# Altium footprint library IC.PcbLib: 163 footprints (part 4 of 11)
Each footprint in its own frame and in the unit in brackets; x right, y up, seen from the top. Pads: shape width x height; smd on the part's side, far side on the other; paste and mask are expansions set on the pad; w line width, h text height; cw(c..) or ccw(c..) is an arc to the next point about the centre after c.
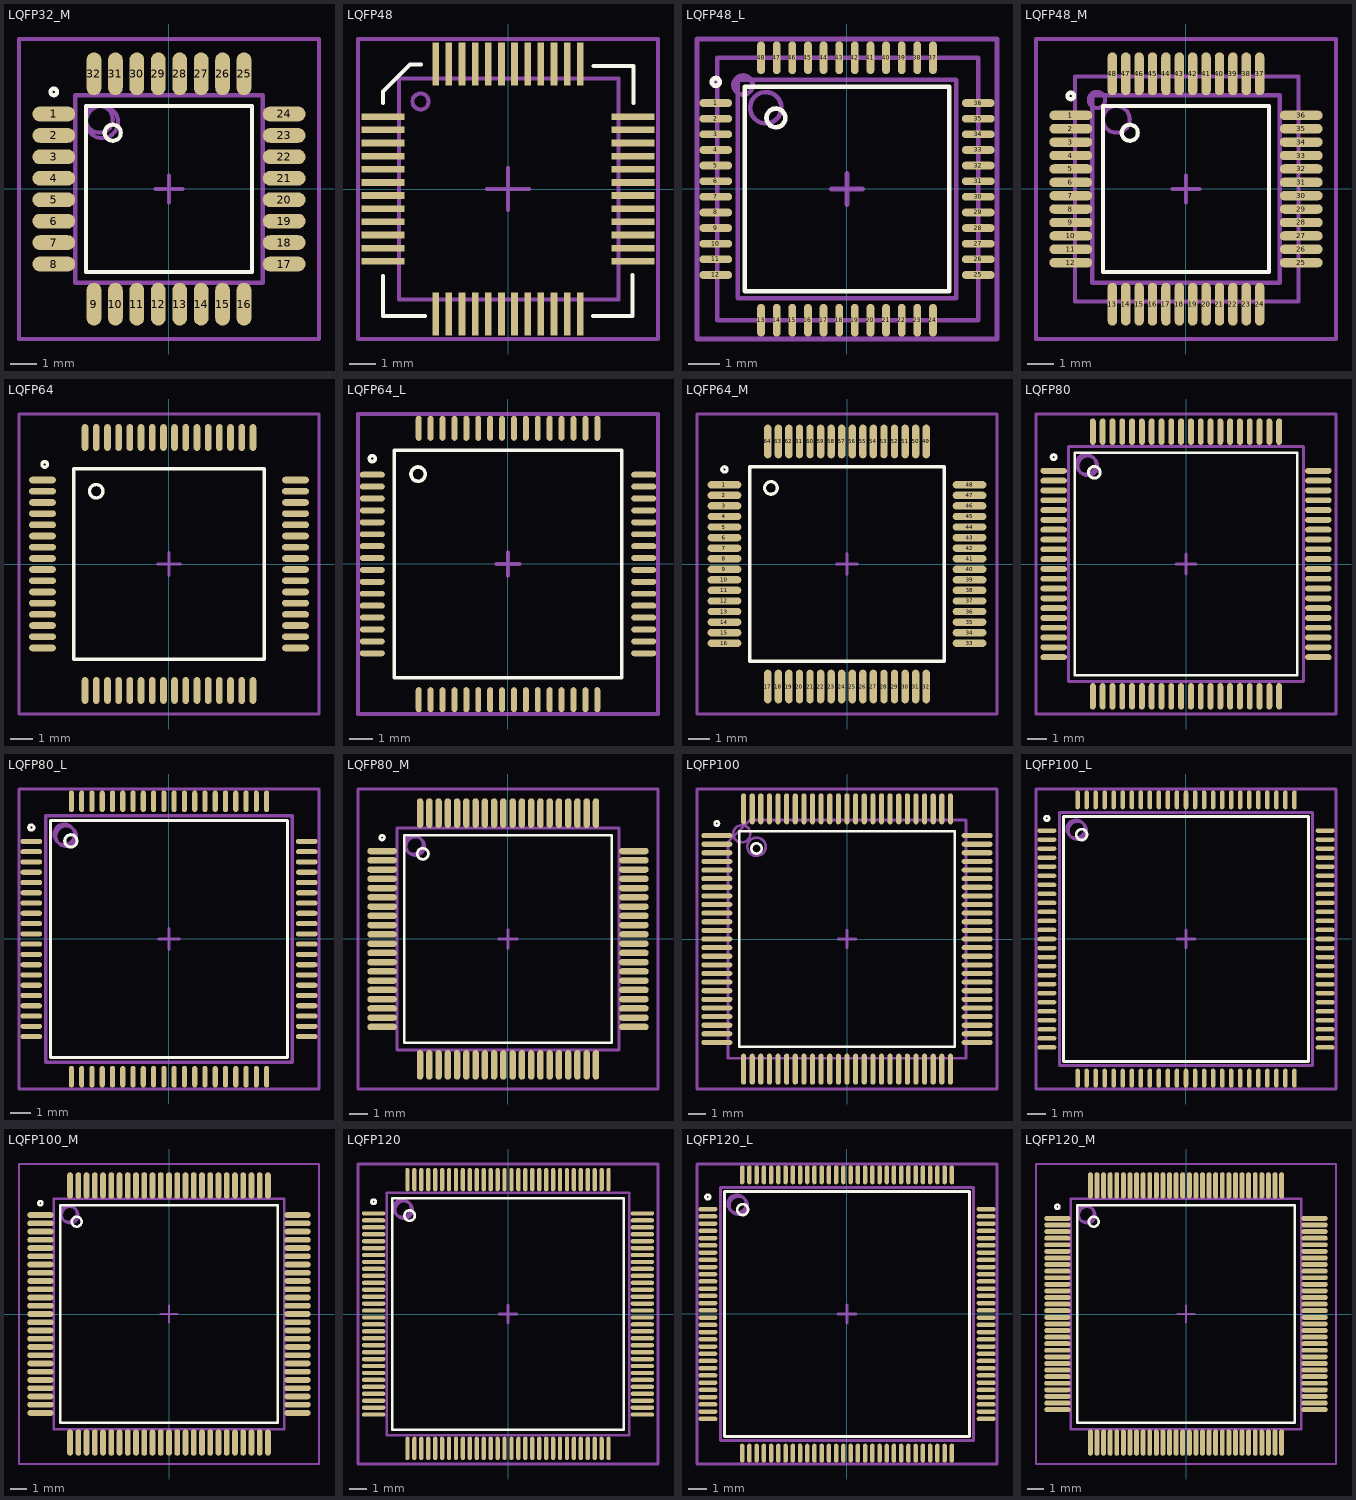
[diagram p3: the footprints below, top view; thin cyan lines are the x and y axes]

## LQFP32_M [mm] "TQFP, 32-Leads, Body 7,00x7,00mm, Pitch 0,80mm, IPC Low Density"
height 1.5
pads (32):
  oval 1.6x0.55 smd: 1(-4.3,2.8) 2(-4.3,2) 3(-4.3,1.2) 4(-4.3,0.4) 5(-4.3,-0.4) 6(-4.3,-1.2) 7(-4.3,-2) 8(-4.3,-2.8) 17(4.3,-2.8) 18(4.3,-2) 19(4.3,-1.2) 20(4.3,-0.4) 21(4.3,0.4) 22(4.3,1.2) 23(4.3,2) 24(4.3,2.8)
  oval 0.55x1.6 smd: 9(-2.8,-4.3) 10(-2,-4.3) 11(-1.2,-4.3) 12(-0.4,-4.3) 13(0.4,-4.3) 14(1.2,-4.3) 15(2,-4.3) 16(2.8,-4.3) 25(2.8,4.3) 26(2,4.3) 27(1.2,4.3) 28(0.4,4.3) 29(-0.4,4.3) 30(-1.2,4.3) 31(-2,4.3) 32(-2.8,4.3)
Top Overlay:
  circle w0.15: c-2.1,2.1 r0.3
  circle w0.15: c-4.3,3.625 r0.125
  lines w0.15: -3.1,-3.1 3.1,-3.1 3.1,3.1 -3.1,3.1 -3.1,-3.1
Mechanical 13:
  circle w0.15: c-2.6,2.6 r0.5
  lines w0.15: -3.5,-3.5 3.5,-3.5 3.5,3.5 -3.5,3.5 -3.5,-3.5
Mechanical 15:
  lines w0.15: -0.5,0 0.5,0 ; 0,-0.5 0,0.5 ; -5.6,-5.6 5.6,-5.6 5.6,5.6 -5.6,5.6 -5.6,-5.6
Mechanical 29:
  circle w0.15: c-2.5,2.5 r0.6
  lines w0.15: -3.5,-3.5 3.5,-3.5 3.5,3.5 -3.5,3.5 -3.5,-3.5
  text ".Designator" at -2.8,-0.3 h1
3D body: height 1.5, standoff 0.1, extent -3.5,-3.5 3.5,3.5

## LQFP48 [mm]
pads (48):
  rect 1.65x0.254 smd: 1(-4.75,2.75) 2(-4.75,2.25) 3(-4.75,1.75) 4(-4.75,1.25) 5(-4.75,0.75) 6(-4.75,0.25) 7(-4.75,-0.25) 8(-4.75,-0.75) 9(-4.75,-1.25) 10(-4.75,-1.75) 11(-4.75,-2.25) 12(-4.75,-2.75) 25(4.75,-2.75) 26(4.75,-2.25) 27(4.75,-1.75) 28(4.75,-1.25) 29(4.75,-0.75) 30(4.75,-0.25) 31(4.75,0.25) 32(4.75,0.75) 33(4.75,1.25) 34(4.75,1.75) 35(4.75,2.25) 36(4.75,2.75)
  rect 0.254x1.65 smd: 13(-2.75,-4.75) 14(-2.25,-4.75) 15(-1.75,-4.75) 16(-1.25,-4.75) 17(-0.75,-4.75) 18(-0.25,-4.75) 19(0.25,-4.75) 20(0.75,-4.75) 21(1.25,-4.75) 22(1.75,-4.75) 23(2.25,-4.75) 24(2.75,-4.75) 37(2.75,4.75) 38(2.25,4.75) 39(1.75,4.75) 40(1.25,4.75) 41(0.75,4.75) 42(0.25,4.75) 43(-0.25,4.75) 44(-0.75,4.75) 45(-1.25,4.75) 46(-1.75,4.75) 47(-2.25,4.75) 48(-2.75,4.75)
Top Overlay:
  lines w0.15: -4.75,-3.3 -4.75,-4.825 -3.15,-4.825 ; -4.75,3.275 -4.75,3.7 -3.725,4.725 -3.3,4.725 ; 3.225,-4.825 4.725,-4.825 4.725,-3.275 ; 3.25,4.675 4.775,4.675 4.775,3.275
Mechanical 15:
  lines w0.15: -0.8,0 0,0 ; 0,-0.8 0,0 ; 0,0.8 0,0 ; 0.8,0 0,0 ; -5.7,-5.7 5.7,-5.7 5.7,5.7 -5.7,5.7 -5.7,-5.7
Mechanical 29:
  circle w0.15: c-3.325,3.325 r0.305
  lines w0.15: -4.15,-4.2 4.2,-4.2 4.2,4.2 -4.15,4.2 -4.15,-4.2
  text ".Designator" at -3.1,-0.2 h1
3D body "User Library-Quad50M48.step": height 1.56, standoff 0, extent -4.5,-4.511 4.5,4.489

## LQFP48_L [mm] "TSQFP, 48-Leads, Body 7,00x7,00mm, Pitch 0,50mm, IPC High Density"
height 1.5
pads (48):
  oval 1.05x0.25 smd: 1(-4.2,2.75) 2(-4.2,2.25) 3(-4.2,1.75) 4(-4.2,1.25) 5(-4.2,0.75) 6(-4.2,0.25) 7(-4.2,-0.25) 8(-4.2,-0.75) 9(-4.2,-1.25) 10(-4.2,-1.75) 11(-4.2,-2.25) 12(-4.2,-2.75) 25(4.2,-2.75) 26(4.2,-2.25) 27(4.2,-1.75) 28(4.2,-1.25) 29(4.2,-0.75) 30(4.2,-0.25) 31(4.2,0.25) 32(4.2,0.75) 33(4.2,1.25) 34(4.2,1.75) 35(4.2,2.25) 36(4.2,2.75)
  oval 0.25x1.05 smd: 13(-2.75,-4.2) 14(-2.25,-4.2) 15(-1.75,-4.2) 16(-1.25,-4.2) 17(-0.75,-4.2) 18(-0.25,-4.2) 19(0.25,-4.2) 20(0.75,-4.2) 21(1.25,-4.2) 22(1.75,-4.2) 23(2.25,-4.2) 24(2.75,-4.2) 37(2.75,4.2) 38(2.25,4.2) 39(1.75,4.2) 40(1.25,4.2) 41(0.75,4.2) 42(0.25,4.2) 43(-0.25,4.2) 44(-0.75,4.2) 45(-1.25,4.2) 46(-1.75,4.2) 47(-2.25,4.2) 48(-2.75,4.2)
Top Overlay:
  circle w0.15: c-2.275,2.275 r0.3
  circle w0.15: c-4.2,3.425 r0.125
  lines w0.15: -3.275,-3.275 3.275,-3.275 3.275,3.275 -3.275,3.275 -3.275,-3.275
Mechanical 13:
  circle w0.15: c-2.6,2.6 r0.5
  lines w0.15: -3.5,-3.5 3.5,-3.5 3.5,3.5 -3.5,3.5 -3.5,-3.5
Mechanical 15:
  lines w0.15: -0.5,0 0.5,0 ; 0,-0.5 0,0.5 ; -4.8,-4.8 4.8,-4.8 4.8,4.8 -4.8,4.8 -4.8,-4.8
Mechanical 29:
  circle w0.15: c-3.325,3.325 r0.305
  lines w0.15: -4.15,-4.2 4.2,-4.2 4.2,4.2 -4.15,4.2 -4.15,-4.2
  text ".Designator" at -3.1,-0.3 h1
3D body: height 1.5, standoff 0.1, extent -3.5,-3.5 3.5,3.5

## LQFP48_M [mm] "TSQFP, 48-Leads, Body 7,00x7,00mm, Pitch 0,50mm, IPC Low Density"
height 1.5
pads (48):
  oval 1.6x0.35 smd: 1(-4.3,2.75) 2(-4.3,2.25) 3(-4.3,1.75) 4(-4.3,1.25) 5(-4.3,0.75) 6(-4.3,0.25) 7(-4.3,-0.25) 8(-4.3,-0.75) 9(-4.3,-1.25) 10(-4.3,-1.75) 11(-4.3,-2.25) 12(-4.3,-2.75) 25(4.3,-2.75) 26(4.3,-2.25) 27(4.3,-1.75) 28(4.3,-1.25) 29(4.3,-0.75) 30(4.3,-0.25) 31(4.3,0.25) 32(4.3,0.75) 33(4.3,1.25) 34(4.3,1.75) 35(4.3,2.25) 36(4.3,2.75)
  oval 0.35x1.6 smd: 13(-2.75,-4.3) 14(-2.25,-4.3) 15(-1.75,-4.3) 16(-1.25,-4.3) 17(-0.75,-4.3) 18(-0.25,-4.3) 19(0.25,-4.3) 20(0.75,-4.3) 21(1.25,-4.3) 22(1.75,-4.3) 23(2.25,-4.3) 24(2.75,-4.3) 37(2.75,4.3) 38(2.25,4.3) 39(1.75,4.3) 40(1.25,4.3) 41(0.75,4.3) 42(0.25,4.3) 43(-0.25,4.3) 44(-0.75,4.3) 45(-1.25,4.3) 46(-1.75,4.3) 47(-2.25,4.3) 48(-2.75,4.3)
Top Overlay:
  circle w0.15: c-2.1,2.1 r0.3
  circle w0.15: c-4.3,3.475 r0.125
  lines w0.15: -3.1,-3.1 3.1,-3.1 3.1,3.1 -3.1,3.1 -3.1,-3.1
Mechanical 13:
  circle w0.15: c-2.6,2.6 r0.5
  lines w0.15: -3.5,-3.5 3.5,-3.5 3.5,3.5 -3.5,3.5 -3.5,-3.5
Mechanical 15:
  lines w0.15: -0.5,0 0.5,0 ; 0,-0.5 0,0.5 ; -5.6,-5.6 5.6,-5.6 5.6,5.6 -5.6,5.6 -5.6,-5.6
Mechanical 29:
  circle w0.15: c-3.325,3.325 r0.305
  lines w0.15: -4.15,-4.2 4.2,-4.2 4.2,4.2 -4.15,4.2 -4.15,-4.2
  text ".Designator" at -3.1,-0.4 h1
3D body: height 1.5, standoff 0.1, extent -3.5,-3.5 3.5,3.5

## LQFP64 [mm]
height 1.6
pads (64):
  oval 1.2x0.3 smd: 1(-5.65,3.75) 2(-5.65,3.25) 3(-5.65,2.75) 4(-5.65,2.25) 5(-5.65,1.75) 6(-5.65,1.25) 7(-5.65,0.75) 8(-5.65,0.25) 9(-5.65,-0.25) 10(-5.65,-0.75) 11(-5.65,-1.25) 12(-5.65,-1.75) 13(-5.65,-2.25) 14(-5.65,-2.75) 15(-5.65,-3.25) 16(-5.65,-3.75) 33(5.65,-3.75) 34(5.65,-3.25) 35(5.65,-2.75) 36(5.65,-2.25) 37(5.65,-1.75) 38(5.65,-1.25) 39(5.65,-0.75) 40(5.65,-0.25) 41(5.65,0.25) 42(5.65,0.75) 43(5.65,1.25) 44(5.65,1.75) 45(5.65,2.25) 46(5.65,2.75) 47(5.65,3.25) 48(5.65,3.75)
  oval 0.3x1.2 smd: 17(-3.75,-5.65) 18(-3.25,-5.65) 19(-2.75,-5.65) 20(-2.25,-5.65) 21(-1.75,-5.65) 22(-1.25,-5.65) 23(-0.75,-5.65) 24(-0.25,-5.65) 25(0.25,-5.65) 26(0.75,-5.65) 27(1.25,-5.65) 28(1.75,-5.65) 29(2.25,-5.65) 30(2.75,-5.65) 31(3.25,-5.65) 32(3.75,-5.65) 49(3.75,5.65) 50(3.25,5.65) 51(2.75,5.65) 52(2.25,5.65) 53(1.75,5.65) 54(1.25,5.65) 55(0.75,5.65) 56(0.25,5.65) 57(-0.25,5.65) 58(-0.75,5.65) 59(-1.25,5.65) 60(-1.75,5.65) 61(-2.25,5.65) 62(-2.75,5.65) 63(-3.25,5.65) 64(-3.75,5.65)
Top Overlay:
  circle w0.15: c-5.55,4.45 r0.125
  circle w0.15: c-3.25,3.25 r0.3
  lines w0.15: -4.25,-4.25 -4.25,4.25 4.25,4.25 4.25,-4.25 -4.25,-4.25
Mechanical 15:
  lines w0.15: -0.5,0 0.5,0 ; 0,-0.5 0,0.5 ; -6.7,-6.7 -6.7,6.7 6.7,6.7 6.7,-6.7 -6.7,-6.7
3D body "User Library-LQFP64-1.step": height 1.56, standoff 0, extent -6,-6 6,6

## LQFP64_L [mm] "TSQFP, 64-Leads, Body 10,00x10,00mm, Pitch 0,50mm, IPC High Density"
height 1.5
pads (64):
  oval 1.05x0.25 smd: 1(-5.7,3.75) 2(-5.7,3.25) 3(-5.7,2.75) 4(-5.7,2.25) 5(-5.7,1.75) 6(-5.7,1.25) 7(-5.7,0.75) 8(-5.7,0.25) 9(-5.7,-0.25) 10(-5.7,-0.75) 11(-5.7,-1.25) 12(-5.7,-1.75) 13(-5.7,-2.25) 14(-5.7,-2.75) 15(-5.7,-3.25) 16(-5.7,-3.75) 33(5.7,-3.75) 34(5.7,-3.25) 35(5.7,-2.75) 36(5.7,-2.25) 37(5.7,-1.75) 38(5.7,-1.25) 39(5.7,-0.75) 40(5.7,-0.25) 41(5.7,0.25) 42(5.7,0.75) 43(5.7,1.25) 44(5.7,1.75) 45(5.7,2.25) 46(5.7,2.75) 47(5.7,3.25) 48(5.7,3.75)
  oval 0.25x1.05 smd: 17(-3.75,-5.7) 18(-3.25,-5.7) 19(-2.75,-5.7) 20(-2.25,-5.7) 21(-1.75,-5.7) 22(-1.25,-5.7) 23(-0.75,-5.7) 24(-0.25,-5.7) 25(0.25,-5.7) 26(0.75,-5.7) 27(1.25,-5.7) 28(1.75,-5.7) 29(2.25,-5.7) 30(2.75,-5.7) 31(3.25,-5.7) 32(3.75,-5.7) 49(3.75,5.7) 50(3.25,5.7) 51(2.75,5.7) 52(2.25,5.7) 53(1.75,5.7) 54(1.25,5.7) 55(0.75,5.7) 56(0.25,5.7) 57(-0.25,5.7) 58(-0.75,5.7) 59(-1.25,5.7) 60(-1.75,5.7) 61(-2.25,5.7) 62(-2.75,5.7) 63(-3.25,5.7) 64(-3.75,5.7)
Top Overlay:
  circle w0.15: c-3.775,3.775 r0.3
  circle w0.15: c-5.7,4.425 r0.125
  lines w0.15: -4.775,-4.775 4.775,-4.775 4.775,4.775 -4.775,4.775 -4.775,-4.775
Mechanical 15:
  lines w0.15: -0.5,0 0.5,0 ; 0,-0.5 0,0.5 ; -6.3,-6.3 6.3,-6.3 6.3,6.3 -6.3,6.3 -6.3,-6.3
3D body "User Library-LQFP64-1.step": height 1.56, standoff 0, extent -6,-6 6,6

## LQFP64_M [mm] "TSQFP, 64-Leads, Body 10,00x10,00mm, Pitch 0,50mm, IPC Low Density"
height 1.5
pads (64):
  oval 1.6x0.35 smd: 1(-5.8,3.75) 2(-5.8,3.25) 3(-5.8,2.75) 4(-5.8,2.25) 5(-5.8,1.75) 6(-5.8,1.25) 7(-5.8,0.75) 8(-5.8,0.25) 9(-5.8,-0.25) 10(-5.8,-0.75) 11(-5.8,-1.25) 12(-5.8,-1.75) 13(-5.8,-2.25) 14(-5.8,-2.75) 15(-5.8,-3.25) 16(-5.8,-3.75) 33(5.8,-3.75) 34(5.8,-3.25) 35(5.8,-2.75) 36(5.8,-2.25) 37(5.8,-1.75) 38(5.8,-1.25) 39(5.8,-0.75) 40(5.8,-0.25) 41(5.8,0.25) 42(5.8,0.75) 43(5.8,1.25) 44(5.8,1.75) 45(5.8,2.25) 46(5.8,2.75) 47(5.8,3.25) 48(5.8,3.75)
  oval 0.35x1.6 smd: 17(-3.75,-5.8) 18(-3.25,-5.8) 19(-2.75,-5.8) 20(-2.25,-5.8) 21(-1.75,-5.8) 22(-1.25,-5.8) 23(-0.75,-5.8) 24(-0.25,-5.8) 25(0.25,-5.8) 26(0.75,-5.8) 27(1.25,-5.8) 28(1.75,-5.8) 29(2.25,-5.8) 30(2.75,-5.8) 31(3.25,-5.8) 32(3.75,-5.8) 49(3.75,5.8) 50(3.25,5.8) 51(2.75,5.8) 52(2.25,5.8) 53(1.75,5.8) 54(1.25,5.8) 55(0.75,5.8) 56(0.25,5.8) 57(-0.25,5.8) 58(-0.75,5.8) 59(-1.25,5.8) 60(-1.75,5.8) 61(-2.25,5.8) 62(-2.75,5.8) 63(-3.25,5.8) 64(-3.75,5.8)
Top Overlay:
  circle w0.15: c-3.6,3.6 r0.3
  circle w0.15: c-5.8,4.475 r0.125
  lines w0.15: -4.6,-4.6 4.6,-4.6 4.6,4.6 -4.6,4.6 -4.6,-4.6
Mechanical 15:
  lines w0.15: -0.5,0 0.5,0 ; 0,-0.5 0,0.5 ; -7.1,-7.1 7.1,-7.1 7.1,7.1 -7.1,7.1 -7.1,-7.1
3D body "User Library-LQFP64-1.step": height 1.56, standoff 0, extent -6,-6 6,6

## LQFP80 [mm] "TSQFP, 80-Leads, Body 12,00x12,00mm, Pitch 0,50mm, IPC Medium Density"
height 1.5
pads (80):
  oval 1.35x0.3 smd: 1(-6.75,4.75) 2(-6.75,4.25) 3(-6.75,3.75) 4(-6.75,3.25) 5(-6.75,2.75) 6(-6.75,2.25) 7(-6.75,1.75) 8(-6.75,1.25) 9(-6.75,0.75) 10(-6.75,0.25) 11(-6.75,-0.25) 12(-6.75,-0.75) 13(-6.75,-1.25) 14(-6.75,-1.75) 15(-6.75,-2.25) 16(-6.75,-2.75) 17(-6.75,-3.25) 18(-6.75,-3.75) 19(-6.75,-4.25) 20(-6.75,-4.75) 41(6.75,-4.75) 42(6.75,-4.25) 43(6.75,-3.75) 44(6.75,-3.25) 45(6.75,-2.75) 46(6.75,-2.25) 47(6.75,-1.75) 48(6.75,-1.25) 49(6.75,-0.75) 50(6.75,-0.25) 51(6.75,0.25) 52(6.75,0.75) 53(6.75,1.25) 54(6.75,1.75) 55(6.75,2.25) 56(6.75,2.75) 57(6.75,3.25) 58(6.75,3.75) 59(6.75,4.25) 60(6.75,4.75)
  oval 0.3x1.35 smd: 21(-4.75,-6.75) 22(-4.25,-6.75) 23(-3.75,-6.75) 24(-3.25,-6.75) 25(-2.75,-6.75) 26(-2.25,-6.75) 27(-1.75,-6.75) 28(-1.25,-6.75) 29(-0.75,-6.75) 30(-0.25,-6.75) 31(0.25,-6.75) 32(0.75,-6.75) 33(1.25,-6.75) 34(1.75,-6.75) 35(2.25,-6.75) 36(2.75,-6.75) 37(3.25,-6.75) 38(3.75,-6.75) 39(4.25,-6.75) 40(4.75,-6.75) 61(4.75,6.75) 62(4.25,6.75) 63(3.75,6.75) 64(3.25,6.75) 65(2.75,6.75) 66(2.25,6.75) 67(1.75,6.75) 68(1.25,6.75) 69(0.75,6.75) 70(0.25,6.75) 71(-0.25,6.75) 72(-0.75,6.75) 73(-1.25,6.75) 74(-1.75,6.75) 75(-2.25,6.75) 76(-2.75,6.75) 77(-3.25,6.75) 78(-3.75,6.75) 79(-4.25,6.75) 80(-4.75,6.75)
Top Overlay:
  circle w0.15: c-6.75,5.45 r0.125
  circle w0.15: c-4.675,4.675 r0.3
  lines w0.15: -5.675,-5.675 -5.675,5.675 5.675,5.675 5.675,-5.675 -5.675,-5.675
Mechanical 13:
  circle w0.15: c-5.1,5.1 r0.5
  lines w0.15: -6,-6 -6,6 6,6 6,-6 -6,-6
Mechanical 15:
  lines w0.15: -0.5,0 0.5,0 ; 0,-0.5 0,0.5 ; -7.65,-7.65 -7.65,7.65 7.65,7.65 7.65,-7.65 -7.65,-7.65
Mechanical 29:
  circle w0.15: c-5,5 r0.5
  lines w0.15: -6,-6 -6,6 6,6 6,-6 -6,-6
  text ".Designator" at -3.4,-0.2 h1
3D body: height 1.5, standoff 0.1, extent -6,-6 6,6

## LQFP80_L [mm] "TSQFP, 80-Leads, Body 12,00x12,00mm, Pitch 0,50mm, IPC High Density"
height 1.5
pads (80):
  oval 1.05x0.25 smd: 1(-6.7,4.75) 2(-6.7,4.25) 3(-6.7,3.75) 4(-6.7,3.25) 5(-6.7,2.75) 6(-6.7,2.25) 7(-6.7,1.75) 8(-6.7,1.25) 9(-6.7,0.75) 10(-6.7,0.25) 11(-6.7,-0.25) 12(-6.7,-0.75) 13(-6.7,-1.25) 14(-6.7,-1.75) 15(-6.7,-2.25) 16(-6.7,-2.75) 17(-6.7,-3.25) 18(-6.7,-3.75) 19(-6.7,-4.25) 20(-6.7,-4.75) 41(6.7,-4.75) 42(6.7,-4.25) 43(6.7,-3.75) 44(6.7,-3.25) 45(6.7,-2.75) 46(6.7,-2.25) 47(6.7,-1.75) 48(6.7,-1.25) 49(6.7,-0.75) 50(6.7,-0.25) 51(6.7,0.25) 52(6.7,0.75) 53(6.7,1.25) 54(6.7,1.75) 55(6.7,2.25) 56(6.7,2.75) 57(6.7,3.25) 58(6.7,3.75) 59(6.7,4.25) 60(6.7,4.75)
  oval 0.25x1.05 smd: 21(-4.75,-6.7) 22(-4.25,-6.7) 23(-3.75,-6.7) 24(-3.25,-6.7) 25(-2.75,-6.7) 26(-2.25,-6.7) 27(-1.75,-6.7) 28(-1.25,-6.7) 29(-0.75,-6.7) 30(-0.25,-6.7) 31(0.25,-6.7) 32(0.75,-6.7) 33(1.25,-6.7) 34(1.75,-6.7) 35(2.25,-6.7) 36(2.75,-6.7) 37(3.25,-6.7) 38(3.75,-6.7) 39(4.25,-6.7) 40(4.75,-6.7) 61(4.75,6.7) 62(4.25,6.7) 63(3.75,6.7) 64(3.25,6.7) 65(2.75,6.7) 66(2.25,6.7) 67(1.75,6.7) 68(1.25,6.7) 69(0.75,6.7) 70(0.25,6.7) 71(-0.25,6.7) 72(-0.75,6.7) 73(-1.25,6.7) 74(-1.75,6.7) 75(-2.25,6.7) 76(-2.75,6.7) 77(-3.25,6.7) 78(-3.75,6.7) 79(-4.25,6.7) 80(-4.75,6.7)
Top Overlay:
  circle w0.15: c-6.7,5.425 r0.125
  circle w0.15: c-4.775,4.775 r0.3
  lines w0.15: -5.775,-5.775 -5.775,5.775 5.775,5.775 5.775,-5.775 -5.775,-5.775
Mechanical 13:
  circle w0.15: c-5.1,5.1 r0.5
  lines w0.15: -6,-6 -6,6 6,6 6,-6 -6,-6
Mechanical 15:
  lines w0.15: -0.5,0 0.5,0 ; 0,-0.5 0,0.5 ; -7.3,-7.3 -7.3,7.3 7.3,7.3 7.3,-7.3 -7.3,-7.3
Mechanical 29:
  circle w0.15: c-5,5 r0.5
  lines w0.15: -6,-6 6,-6 6,6 -6,6 -6,-6
  text ".Designator" at -3.2,-0.3 h1
3D body: height 1.5, standoff 0.1, extent -6,-6 6,6

## LQFP80_M [mm] "TSQFP, 80-Leads, Body 12,00x12,00mm, Pitch 0,50mm, IPC Low Density"
height 1.5
pads (80):
  oval 1.6x0.35 smd: 1(-6.8,4.75) 2(-6.8,4.25) 3(-6.8,3.75) 4(-6.8,3.25) 5(-6.8,2.75) 6(-6.8,2.25) 7(-6.8,1.75) 8(-6.8,1.25) 9(-6.8,0.75) 10(-6.8,0.25) 11(-6.8,-0.25) 12(-6.8,-0.75) 13(-6.8,-1.25) 14(-6.8,-1.75) 15(-6.8,-2.25) 16(-6.8,-2.75) 17(-6.8,-3.25) 18(-6.8,-3.75) 19(-6.8,-4.25) 20(-6.8,-4.75) 41(6.8,-4.75) 42(6.8,-4.25) 43(6.8,-3.75) 44(6.8,-3.25) 45(6.8,-2.75) 46(6.8,-2.25) 47(6.8,-1.75) 48(6.8,-1.25) 49(6.8,-0.75) 50(6.8,-0.25) 51(6.8,0.25) 52(6.8,0.75) 53(6.8,1.25) 54(6.8,1.75) 55(6.8,2.25) 56(6.8,2.75) 57(6.8,3.25) 58(6.8,3.75) 59(6.8,4.25) 60(6.8,4.75)
  oval 0.35x1.6 smd: 21(-4.75,-6.8) 22(-4.25,-6.8) 23(-3.75,-6.8) 24(-3.25,-6.8) 25(-2.75,-6.8) 26(-2.25,-6.8) 27(-1.75,-6.8) 28(-1.25,-6.8) 29(-0.75,-6.8) 30(-0.25,-6.8) 31(0.25,-6.8) 32(0.75,-6.8) 33(1.25,-6.8) 34(1.75,-6.8) 35(2.25,-6.8) 36(2.75,-6.8) 37(3.25,-6.8) 38(3.75,-6.8) 39(4.25,-6.8) 40(4.75,-6.8) 61(4.75,6.8) 62(4.25,6.8) 63(3.75,6.8) 64(3.25,6.8) 65(2.75,6.8) 66(2.25,6.8) 67(1.75,6.8) 68(1.25,6.8) 69(0.75,6.8) 70(0.25,6.8) 71(-0.25,6.8) 72(-0.75,6.8) 73(-1.25,6.8) 74(-1.75,6.8) 75(-2.25,6.8) 76(-2.75,6.8) 77(-3.25,6.8) 78(-3.75,6.8) 79(-4.25,6.8) 80(-4.75,6.8)
Top Overlay:
  circle w0.15: c-4.6,4.6 r0.3
  circle w0.15: c-6.8,5.475 r0.125
  lines w0.15: -5.6,-5.6 5.6,-5.6 5.6,5.6 -5.6,5.6 -5.6,-5.6
Mechanical 13:
  circle w0.15: c-5.1,5.1 r0.5
  lines w0.15: -6,-6 6,-6 6,6 -6,6 -6,-6
Mechanical 15:
  lines w0.15: -0.5,0 0.5,0 ; 0,-0.5 0,0.5 ; -8.1,-8.1 8.1,-8.1 8.1,8.1 -8.1,8.1 -8.1,-8.1
Mechanical 29:
  circle w0.15: c-5,5 r0.5
  lines w0.15: -6,-6 -6,6 6,6 6,-6 -6,-6
  text ".Designator" at -3.6,-0.3 h1
3D body: height 1.5, standoff 0.1, extent -6,-6 6,6

## LQFP100 [mm] "Thin QFP, 100-Leads, Body 14x14mm, Pitch 0.5mm, IPC Medium Density"
height 1.6
pads (100):
  oval 1.8x0.3 smd: 1(-7.55,6) 2(-7.55,5.5) 3(-7.55,5) 4(-7.55,4.5) 5(-7.55,4) 6(-7.55,3.5) 7(-7.55,3) 8(-7.55,2.5) 9(-7.55,2) 10(-7.55,1.5) 11(-7.55,1) 12(-7.55,0.5) 13(-7.55,0) 14(-7.55,-0.5) 15(-7.55,-1) 16(-7.55,-1.5) 17(-7.55,-2) 18(-7.55,-2.5) 19(-7.55,-3) 20(-7.55,-3.5) 21(-7.55,-4) 22(-7.55,-4.5) 23(-7.55,-5) 24(-7.55,-5.5) 25(-7.55,-6) 51(7.55,-6) 52(7.55,-5.5) 53(7.55,-5) 54(7.55,-4.5) 55(7.55,-4) 56(7.55,-3.5) 57(7.55,-3) 58(7.55,-2.5) 59(7.55,-2) 60(7.55,-1.5) 61(7.55,-1) 62(7.55,-0.5) 63(7.55,0) 64(7.55,0.5) 65(7.55,1) 66(7.55,1.5) 67(7.55,2) 68(7.55,2.5) 69(7.55,3) 70(7.55,3.5) 71(7.55,4) 72(7.55,4.5) 73(7.55,5) 74(7.55,5.5) 75(7.55,6)
  oval 0.3x1.8 smd: 26(-6,-7.55) 27(-5.5,-7.55) 28(-5,-7.55) 29(-4.5,-7.55) 30(-4,-7.55) 31(-3.5,-7.55) 32(-3,-7.55) 33(-2.5,-7.55) 34(-2,-7.55) 35(-1.5,-7.55) 36(-1,-7.55) 37(-0.5,-7.55) 38(0,-7.55) 39(0.5,-7.55) 40(1,-7.55) 41(1.5,-7.55) 42(2,-7.55) 43(2.5,-7.55) 44(3,-7.55) 45(3.5,-7.55) 46(4,-7.55) 47(4.5,-7.55) 48(5,-7.55) 49(5.5,-7.55) 50(6,-7.55) 76(6,7.55) 77(5.5,7.55) 78(5,7.55) 79(4.5,7.55) 80(4,7.55) 81(3.5,7.55) 82(3,7.55) 83(2.5,7.55) 84(2,7.55) 85(1.5,7.55) 86(1,7.55) 87(0.5,7.55) 88(0,7.55) 89(-0.5,7.55) 90(-1,7.55) 91(-1.5,7.55) 92(-2,7.55) 93(-2.5,7.55) 94(-3,7.55) 95(-3.5,7.55) 96(-4,7.55) 97(-4.5,7.55) 98(-5,7.55) 99(-5.5,7.55) 100(-6,7.55)
Top Overlay:
  circle w0.15: c-7.55,6.7 r0.125
  circle w0.15: c-5.25,5.25 r0.3
  lines w0.15: -6.25,-6.25 -6.25,6.25 6.25,6.25 6.25,-6.25 -6.25,-6.25
Mechanical 13:
  circle w0.15: c-6.1,6.1 r0.5
Mechanical 15:
  lines w0.15: -0.5,0 0.5,0 ; 0,-0.5 0,0.5 ; -8.7,-8.7 -8.7,8.7 8.7,8.7 8.7,-8.7 -8.7,-8.7
Mechanical 29:
  circle w0.15: c-5.25,5.35 r0.53
  lines w0.15: -6.9,-6.925 -6.9,5.625 -5.625,6.9 6.9,6.9 6.9,-6.925 -6.9,-6.925
  text ".Designator" at -3.2,-0.3 h1
3D body: height 1.6, standoff 0, extent -8,-8 8,8

## LQFP100_L [mm] "TSQFP, 100-Leads, Body 14,00x14,00mm, Pitch 0,50mm, IPC High Density"
height 1.5
pads (100):
  oval 1.05x0.25 smd: 1(-7.7,6) 2(-7.7,5.5) 3(-7.7,5) 4(-7.7,4.5) 5(-7.7,4) 6(-7.7,3.5) 7(-7.7,3) 8(-7.7,2.5) 9(-7.7,2) 10(-7.7,1.5) 11(-7.7,1) 12(-7.7,0.5) 13(-7.7,0) 14(-7.7,-0.5) 15(-7.7,-1) 16(-7.7,-1.5) 17(-7.7,-2) 18(-7.7,-2.5) 19(-7.7,-3) 20(-7.7,-3.5) 21(-7.7,-4) 22(-7.7,-4.5) 23(-7.7,-5) 24(-7.7,-5.5) 25(-7.7,-6) 51(7.7,-6) 52(7.7,-5.5) 53(7.7,-5) 54(7.7,-4.5) 55(7.7,-4) 56(7.7,-3.5) 57(7.7,-3) 58(7.7,-2.5) 59(7.7,-2) 60(7.7,-1.5) 61(7.7,-1) 62(7.7,-0.5) 63(7.7,0) 64(7.7,0.5) 65(7.7,1) 66(7.7,1.5) 67(7.7,2) 68(7.7,2.5) 69(7.7,3) 70(7.7,3.5) 71(7.7,4) 72(7.7,4.5) 73(7.7,5) 74(7.7,5.5) 75(7.7,6)
  oval 0.25x1.05 smd: 26(-6,-7.7) 27(-5.5,-7.7) 28(-5,-7.7) 29(-4.5,-7.7) 30(-4,-7.7) 31(-3.5,-7.7) 32(-3,-7.7) 33(-2.5,-7.7) 34(-2,-7.7) 35(-1.5,-7.7) 36(-1,-7.7) 37(-0.5,-7.7) 38(0,-7.7) 39(0.5,-7.7) 40(1,-7.7) 41(1.5,-7.7) 42(2,-7.7) 43(2.5,-7.7) 44(3,-7.7) 45(3.5,-7.7) 46(4,-7.7) 47(4.5,-7.7) 48(5,-7.7) 49(5.5,-7.7) 50(6,-7.7) 76(6,7.7) 77(5.5,7.7) 78(5,7.7) 79(4.5,7.7) 80(4,7.7) 81(3.5,7.7) 82(3,7.7) 83(2.5,7.7) 84(2,7.7) 85(1.5,7.7) 86(1,7.7) 87(0.5,7.7) 88(0,7.7) 89(-0.5,7.7) 90(-1,7.7) 91(-1.5,7.7) 92(-2,7.7) 93(-2.5,7.7) 94(-3,7.7) 95(-3.5,7.7) 96(-4,7.7) 97(-4.5,7.7) 98(-5,7.7) 99(-5.5,7.7) 100(-6,7.7)
Top Overlay:
  circle w0.15: c-7.7,6.675 r0.125
  circle w0.15: c-5.775,5.775 r0.3
  lines w0.15: -6.775,-6.775 -6.775,6.775 6.775,6.775 6.775,-6.775 -6.775,-6.775
Mechanical 13:
  circle w0.15: c-6.1,6.1 r0.5
  lines w0.15: -7,-7 -7,7 7,7 7,-7 -7,-7
Mechanical 15:
  lines w0.15: -0.5,0 0.5,0 ; 0,-0.5 0,0.5 ; -8.3,-8.3 -8.3,8.3 8.3,8.3 8.3,-8.3 -8.3,-8.3
Mechanical 29:
  circle w0.15: c-6,6 r0.5
  lines w0.15: -7,-7 7,-7 7,7 -7,7 -7,-7
  text ".Designator" at -3.1,-0.3 h1
3D body: height 1.5, standoff 0.1, extent -7,-7 7,7

## LQFP100_M [mm] "TSQFP, 100-Leads, Body 14,00x14,00mm, Pitch 0,50mm, IPC Low Density"
height 1.5
pads (100):
  oval 1.6x0.35 smd: 1(-7.8,6) 2(-7.8,5.5) 3(-7.8,5) 4(-7.8,4.5) 5(-7.8,4) 6(-7.8,3.5) 7(-7.8,3) 8(-7.8,2.5) 9(-7.8,2) 10(-7.8,1.5) 11(-7.8,1) 12(-7.8,0.5) 13(-7.8,0) 14(-7.8,-0.5) 15(-7.8,-1) 16(-7.8,-1.5) 17(-7.8,-2) 18(-7.8,-2.5) 19(-7.8,-3) 20(-7.8,-3.5) 21(-7.8,-4) 22(-7.8,-4.5) 23(-7.8,-5) 24(-7.8,-5.5) 25(-7.8,-6) 51(7.8,-6) 52(7.8,-5.5) 53(7.8,-5) 54(7.8,-4.5) 55(7.8,-4) 56(7.8,-3.5) 57(7.8,-3) 58(7.8,-2.5) 59(7.8,-2) 60(7.8,-1.5) 61(7.8,-1) 62(7.8,-0.5) 63(7.8,0) 64(7.8,0.5) 65(7.8,1) 66(7.8,1.5) 67(7.8,2) 68(7.8,2.5) 69(7.8,3) 70(7.8,3.5) 71(7.8,4) 72(7.8,4.5) 73(7.8,5) 74(7.8,5.5) 75(7.8,6)
  oval 0.35x1.6 smd: 26(-6,-7.8) 27(-5.5,-7.8) 28(-5,-7.8) 29(-4.5,-7.8) 30(-4,-7.8) 31(-3.5,-7.8) 32(-3,-7.8) 33(-2.5,-7.8) 34(-2,-7.8) 35(-1.5,-7.8) 36(-1,-7.8) 37(-0.5,-7.8) 38(0,-7.8) 39(0.5,-7.8) 40(1,-7.8) 41(1.5,-7.8) 42(2,-7.8) 43(2.5,-7.8) 44(3,-7.8) 45(3.5,-7.8) 46(4,-7.8) 47(4.5,-7.8) 48(5,-7.8) 49(5.5,-7.8) 50(6,-7.8) 76(6,7.8) 77(5.5,7.8) 78(5,7.8) 79(4.5,7.8) 80(4,7.8) 81(3.5,7.8) 82(3,7.8) 83(2.5,7.8) 84(2,7.8) 85(1.5,7.8) 86(1,7.8) 87(0.5,7.8) 88(0,7.8) 89(-0.5,7.8) 90(-1,7.8) 91(-1.5,7.8) 92(-2,7.8) 93(-2.5,7.8) 94(-3,7.8) 95(-3.5,7.8) 96(-4,7.8) 97(-4.5,7.8) 98(-5,7.8) 99(-5.5,7.8) 100(-6,7.8)
Top Overlay:
  circle w0.15: c-5.6,5.6 r0.3
  circle w0.15: c-7.8,6.725 r0.125
  lines w0.15: -6.6,-6.6 6.6,-6.6 6.6,6.6 -6.6,6.6 -6.6,-6.6
Mechanical 13:
  circle w0.15: c-6.1,6.1 r0.5
  lines w0.15: -7,-7 7,-7 7,7 -7,7 -7,-7
Mechanical 15:
  lines w0.15: -0.5,0 0.5,0 ; 0,-0.5 0,0.5 ; -9.1,-9.1 9.1,-9.1 9.1,9.1 -9.1,9.1 -9.1,-9.1
Mechanical 29:
  circle w0.15: c-6,6 r0.5
  lines w0.15: -7,-7 -7,7 7,7 7,-7 -7,-7
  text ".Designator" at -3.1,-0.2 h1
3D body: height 1.5, standoff 0.1, extent -7,-7 7,7

## LQFP120 [mm] "TSQFP, 120-Leads, Body 14,00x14,00mm, Pitch 0,40mm, IPC Medium Density"
height 1.5
pads (120):
  oval 1.35x0.25 smd: 1(-7.75,5.8) 2(-7.75,5.4) 3(-7.75,5) 4(-7.75,4.6) 5(-7.75,4.2) 6(-7.75,3.8) 7(-7.75,3.4) 8(-7.75,3) 9(-7.75,2.6) 10(-7.75,2.2) 11(-7.75,1.8) 12(-7.75,1.4) 13(-7.75,1) 14(-7.75,0.6) 15(-7.75,0.2) 16(-7.75,-0.2) 17(-7.75,-0.6) 18(-7.75,-1) 19(-7.75,-1.4) 20(-7.75,-1.8) 21(-7.75,-2.2) 22(-7.75,-2.6) 23(-7.75,-3) 24(-7.75,-3.4) 25(-7.75,-3.8) 26(-7.75,-4.2) 27(-7.75,-4.6) 28(-7.75,-5) 29(-7.75,-5.4) 30(-7.75,-5.8) 61(7.75,-5.8) 62(7.75,-5.4) 63(7.75,-5) 64(7.75,-4.6) 65(7.75,-4.2) 66(7.75,-3.8) 67(7.75,-3.4) 68(7.75,-3) 69(7.75,-2.6) 70(7.75,-2.2) 71(7.75,-1.8) 72(7.75,-1.4) 73(7.75,-1) 74(7.75,-0.6) 75(7.75,-0.2) 76(7.75,0.2) 77(7.75,0.6) 78(7.75,1) 79(7.75,1.4) 80(7.75,1.8) 81(7.75,2.2) 82(7.75,2.6) 83(7.75,3) 84(7.75,3.4) 85(7.75,3.8) 86(7.75,4.2) 87(7.75,4.6) 88(7.75,5) 89(7.75,5.4) 90(7.75,5.8)
  oval 0.25x1.35 smd: 31(-5.8,-7.75) 32(-5.4,-7.75) 33(-5,-7.75) 34(-4.6,-7.75) 35(-4.2,-7.75) 36(-3.8,-7.75) 37(-3.4,-7.75) 38(-3,-7.75) 39(-2.6,-7.75) 40(-2.2,-7.75) 41(-1.8,-7.75) 42(-1.4,-7.75) 43(-1,-7.75) 44(-0.6,-7.75) 45(-0.2,-7.75) 46(0.2,-7.75) 47(0.6,-7.75) 48(1,-7.75) 49(1.4,-7.75) 50(1.8,-7.75) 51(2.2,-7.75) 52(2.6,-7.75) 53(3,-7.75) 54(3.4,-7.75) 55(3.8,-7.75) 56(4.2,-7.75) 57(4.6,-7.75) 58(5,-7.75) 59(5.4,-7.75) 60(5.8,-7.75) 91(5.8,7.75) 92(5.4,7.75) 93(5,7.75) 94(4.6,7.75) 95(4.2,7.75) 96(3.8,7.75) 97(3.4,7.75) 98(3,7.75) 99(2.6,7.75) 100(2.2,7.75) 101(1.8,7.75) 102(1.4,7.75) 103(1,7.75) 104(0.6,7.75) 105(0.2,7.75) 106(-0.2,7.75) 107(-0.6,7.75) 108(-1,7.75) 109(-1.4,7.75) 110(-1.8,7.75) 111(-2.2,7.75) 112(-2.6,7.75) 113(-3,7.75) 114(-3.4,7.75) 115(-3.8,7.75) 116(-4.2,7.75) 117(-4.6,7.75) 118(-5,7.75) 119(-5.4,7.75) 120(-5.8,7.75)
Top Overlay:
  circle w0.15: c-7.75,6.475 r0.125
  circle w0.15: c-5.675,5.675 r0.3
  lines w0.15: -6.675,-6.675 -6.675,6.675 6.675,6.675 6.675,-6.675 -6.675,-6.675
Mechanical 13:
  circle w0.15: c-6.1,6.1 r0.5
  lines w0.15: -7,-7 -7,7 7,7 7,-7 -7,-7
Mechanical 15:
  lines w0.15: -0.5,0 0.5,0 ; 0,-0.5 0,0.5 ; -8.65,-8.65 -8.65,8.65 8.65,8.65 8.65,-8.65 -8.65,-8.65
Mechanical 29:
  circle w0.15: c-6,6 r0.5
  lines w0.15: -7,-7 7,-7 7,7 -7,7 -7,-7
  text ".Designator" at -3.4,-0.4 h1
3D body: height 1.5, standoff 0.1, extent -7,-7 7,7

## LQFP120_L [mm] "TSQFP, 120-Leads, Body 14,00x14,00mm, Pitch 0,40mm, IPC High Density"
height 1.5
pads (120):
  oval 1.05x0.25 smd: 1(-7.7,5.8) 2(-7.7,5.4) 3(-7.7,5) 4(-7.7,4.6) 5(-7.7,4.2) 6(-7.7,3.8) 7(-7.7,3.4) 8(-7.7,3) 9(-7.7,2.6) 10(-7.7,2.2) 11(-7.7,1.8) 12(-7.7,1.4) 13(-7.7,1) 14(-7.7,0.6) 15(-7.7,0.2) 16(-7.7,-0.2) 17(-7.7,-0.6) 18(-7.7,-1) 19(-7.7,-1.4) 20(-7.7,-1.8) 21(-7.7,-2.2) 22(-7.7,-2.6) 23(-7.7,-3) 24(-7.7,-3.4) 25(-7.7,-3.8) 26(-7.7,-4.2) 27(-7.7,-4.6) 28(-7.7,-5) 29(-7.7,-5.4) 30(-7.7,-5.8) 61(7.7,-5.8) 62(7.7,-5.4) 63(7.7,-5) 64(7.7,-4.6) 65(7.7,-4.2) 66(7.7,-3.8) 67(7.7,-3.4) 68(7.7,-3) 69(7.7,-2.6) 70(7.7,-2.2) 71(7.7,-1.8) 72(7.7,-1.4) 73(7.7,-1) 74(7.7,-0.6) 75(7.7,-0.2) 76(7.7,0.2) 77(7.7,0.6) 78(7.7,1) 79(7.7,1.4) 80(7.7,1.8) 81(7.7,2.2) 82(7.7,2.6) 83(7.7,3) 84(7.7,3.4) 85(7.7,3.8) 86(7.7,4.2) 87(7.7,4.6) 88(7.7,5) 89(7.7,5.4) 90(7.7,5.8)
  oval 0.25x1.05 smd: 31(-5.8,-7.7) 32(-5.4,-7.7) 33(-5,-7.7) 34(-4.6,-7.7) 35(-4.2,-7.7) 36(-3.8,-7.7) 37(-3.4,-7.7) 38(-3,-7.7) 39(-2.6,-7.7) 40(-2.2,-7.7) 41(-1.8,-7.7) 42(-1.4,-7.7) 43(-1,-7.7) 44(-0.6,-7.7) 45(-0.2,-7.7) 46(0.2,-7.7) 47(0.6,-7.7) 48(1,-7.7) 49(1.4,-7.7) 50(1.8,-7.7) 51(2.2,-7.7) 52(2.6,-7.7) 53(3,-7.7) 54(3.4,-7.7) 55(3.8,-7.7) 56(4.2,-7.7) 57(4.6,-7.7) 58(5,-7.7) 59(5.4,-7.7) 60(5.8,-7.7) 91(5.8,7.7) 92(5.4,7.7) 93(5,7.7) 94(4.6,7.7) 95(4.2,7.7) 96(3.8,7.7) 97(3.4,7.7) 98(3,7.7) 99(2.6,7.7) 100(2.2,7.7) 101(1.8,7.7) 102(1.4,7.7) 103(1,7.7) 104(0.6,7.7) 105(0.2,7.7) 106(-0.2,7.7) 107(-0.6,7.7) 108(-1,7.7) 109(-1.4,7.7) 110(-1.8,7.7) 111(-2.2,7.7) 112(-2.6,7.7) 113(-3,7.7) 114(-3.4,7.7) 115(-3.8,7.7) 116(-4.2,7.7) 117(-4.6,7.7) 118(-5,7.7) 119(-5.4,7.7) 120(-5.8,7.7)
Top Overlay:
  circle w0.15: c-7.7,6.475 r0.125
  circle w0.15: c-5.775,5.775 r0.3
  lines w0.15: -6.775,-6.775 -6.775,6.775 6.775,6.775 6.775,-6.775 -6.775,-6.775
Mechanical 13:
  circle w0.15: c-6.1,6.1 r0.5
  lines w0.15: -7,-7 -7,7 7,7 7,-7 -7,-7
Mechanical 15:
  lines w0.15: -0.5,0 0.5,0 ; 0,-0.5 0,0.5 ; -8.3,-8.3 -8.3,8.3 8.3,8.3 8.3,-8.3 -8.3,-8.3
Mechanical 29:
  circle w0.15: c-6,6 r0.5
  lines w0.15: -7,-7 -7,7 7,7 7,-7 -7,-7
  text ".Designator" at -3.3,-0.2 h1
3D body: height 1.5, standoff 0.1, extent -7,-7 7,7

## LQFP120_M [mm] "TSQFP, 120-Leads, Body 14,00x14,00mm, Pitch 0,40mm, IPC Low Density"
height 1.5
pads (120):
  oval 1.6x0.3 smd: 1(-7.8,5.8) 2(-7.8,5.4) 3(-7.8,5) 4(-7.8,4.6) 5(-7.8,4.2) 6(-7.8,3.8) 7(-7.8,3.4) 8(-7.8,3) 9(-7.8,2.6) 10(-7.8,2.2) 11(-7.8,1.8) 12(-7.8,1.4) 13(-7.8,1) 14(-7.8,0.6) 15(-7.8,0.2) 16(-7.8,-0.2) 17(-7.8,-0.6) 18(-7.8,-1) 19(-7.8,-1.4) 20(-7.8,-1.8) 21(-7.8,-2.2) 22(-7.8,-2.6) 23(-7.8,-3) 24(-7.8,-3.4) 25(-7.8,-3.8) 26(-7.8,-4.2) 27(-7.8,-4.6) 28(-7.8,-5) 29(-7.8,-5.4) 30(-7.8,-5.8) 61(7.8,-5.8) 62(7.8,-5.4) 63(7.8,-5) 64(7.8,-4.6) 65(7.8,-4.2) 66(7.8,-3.8) 67(7.8,-3.4) 68(7.8,-3) 69(7.8,-2.6) 70(7.8,-2.2) 71(7.8,-1.8) 72(7.8,-1.4) 73(7.8,-1) 74(7.8,-0.6) 75(7.8,-0.2) 76(7.8,0.2) 77(7.8,0.6) 78(7.8,1) 79(7.8,1.4) 80(7.8,1.8) 81(7.8,2.2) 82(7.8,2.6) 83(7.8,3) 84(7.8,3.4) 85(7.8,3.8) 86(7.8,4.2) 87(7.8,4.6) 88(7.8,5) 89(7.8,5.4) 90(7.8,5.8)
  oval 0.3x1.6 smd: 31(-5.8,-7.8) 32(-5.4,-7.8) 33(-5,-7.8) 34(-4.6,-7.8) 35(-4.2,-7.8) 36(-3.8,-7.8) 37(-3.4,-7.8) 38(-3,-7.8) 39(-2.6,-7.8) 40(-2.2,-7.8) 41(-1.8,-7.8) 42(-1.4,-7.8) 43(-1,-7.8) 44(-0.6,-7.8) 45(-0.2,-7.8) 46(0.2,-7.8) 47(0.6,-7.8) 48(1,-7.8) 49(1.4,-7.8) 50(1.8,-7.8) 51(2.2,-7.8) 52(2.6,-7.8) 53(3,-7.8) 54(3.4,-7.8) 55(3.8,-7.8) 56(4.2,-7.8) 57(4.6,-7.8) 58(5,-7.8) 59(5.4,-7.8) 60(5.8,-7.8) 91(5.8,7.8) 92(5.4,7.8) 93(5,7.8) 94(4.6,7.8) 95(4.2,7.8) 96(3.8,7.8) 97(3.4,7.8) 98(3,7.8) 99(2.6,7.8) 100(2.2,7.8) 101(1.8,7.8) 102(1.4,7.8) 103(1,7.8) 104(0.6,7.8) 105(0.2,7.8) 106(-0.2,7.8) 107(-0.6,7.8) 108(-1,7.8) 109(-1.4,7.8) 110(-1.8,7.8) 111(-2.2,7.8) 112(-2.6,7.8) 113(-3,7.8) 114(-3.4,7.8) 115(-3.8,7.8) 116(-4.2,7.8) 117(-4.6,7.8) 118(-5,7.8) 119(-5.4,7.8) 120(-5.8,7.8)
Top Overlay:
  circle w0.15: c-7.8,6.5 r0.125
  circle w0.15: c-5.6,5.6 r0.3
  lines w0.15: -6.6,-6.6 -6.6,6.6 6.6,6.6 6.6,-6.6 -6.6,-6.6
Mechanical 13:
  circle w0.15: c-6.1,6.1 r0.5
  lines w0.15: -7,-7 -7,7 7,7 7,-7 -7,-7
Mechanical 15:
  lines w0.15: -0.5,0 0.5,0 ; 0,-0.5 0,0.5 ; -9.1,-9.1 -9.1,9.1 9.1,9.1 9.1,-9.1 -9.1,-9.1
Mechanical 29:
  circle w0.15: c-6,6 r0.5
  lines w0.15: -7,-7 -7,7 7,7 7,-7 -7,-7
  text ".Designator" at -1.6,-0.3 h1
3D body: height 1.5, standoff 0.1, extent -7,-7 7,7